# Altium footprint library SG_PCB_Fomin.PcbLib: 74 footprints (part 2 of 5)
Each footprint in its own frame and in the unit in brackets; x right, y up, seen from the top. Pads: shape width x height; smd on the part's side, far side on the other; paste and mask are expansions set on the pad; w line width, h text height; cw(c..) or ccw(c..) is an arc to the next point about the centre after c.
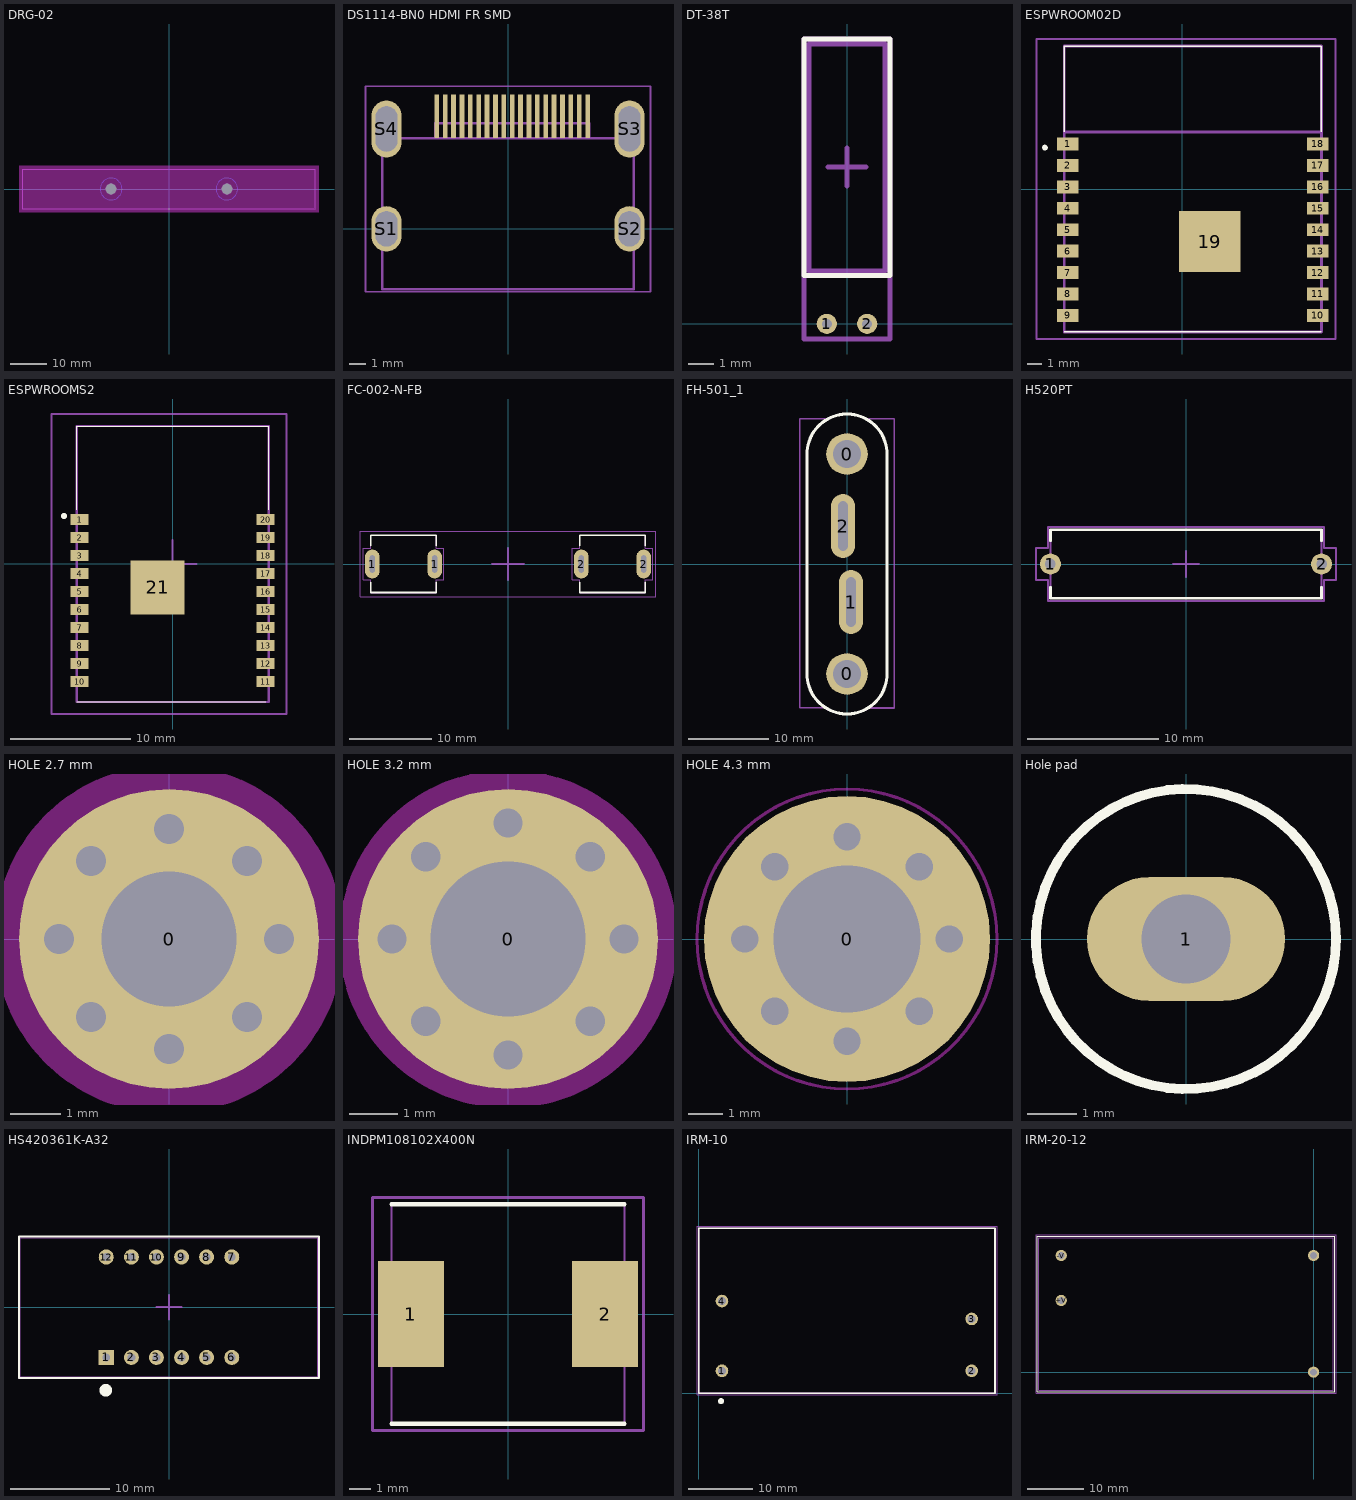
[diagram p1: the footprints below, top view; thin cyan lines are the x and y axes]

## DRG-02 [mm] "DIN RAIL MOUNT"
pads (2):
  round 0 hole 3 unplated: 0(-16,0) 0(16,0)
Top Layer keep-out:
  rectangle: -41.5,-6.5 41.5,6.5
Bottom Layer keep-out:
  circle w0.1: c-16,0 r3
  circle w0.1: c16,0 r3
Top Courtyard:
  lines w0.25: -40.5,-5.5 40.5,-5.5 40.5,5.5 -40.5,5.5 -40.5,-5.5

## DS1114-BN0 HDMI FR SMD [mm] "CON RECPT HDMI THT R/A W/O FLNG"
height 6.1
pads (23):
  rect 0.28x2.6 smd: 1(4.75,6.72) 2(4.25,6.72) 3(3.75,6.72) 4(3.25,6.72) 5(2.75,6.72) 6(2.25,6.72) 7(1.75,6.72) 8(1.25,6.72) 9(0.75,6.72) 10(0.25,6.72) 11(-0.25,6.72) 12(-0.75,6.72) 13(-1.25,6.72) 14(-1.75,6.72) 15(-2.25,6.72) 16(-2.75,6.72) 17(-3.25,6.72) 18(-3.75,6.72) 19(-4.25,6.72)
  oval 1.8x2.7 hole 1.3 slot 2.1 at 90 deg: S1(-7.25,0) S2(7.25,0)
  oval 1.8x3.4 hole 1.3 slot 2.7 at 90 deg: S3(7.25,5.96) S4(-7.25,5.96)
Top Assembly:
  lines w0.15: -7.5,-3.6 7.5,-3.6 ; -7.5,-3.6 -7.5,5.4 ; -7.5,-3.6 7.5,-3.6 ; -7.5,-3.6 -7.5,5.4 ; -7.5,5.4 7.5,5.4 ; -7.5,5.4 7.5,5.4 ; -4.35,6.3 -4.35,5.4 -4.35,6.3 ; -4.35,6.3 4.85,6.3 ; -4.35,6.3 4.85,6.3 ; 4.85,6.3 4.85,5.4 4.85,6.3 ; 7.5,-3.6 7.5,5.4 ; 7.5,-3.6 7.5,5.4
Top Courtyard:
  lines w0.1: -8.5,-3.75 -8.5,-3.575 -8.5,8.5 8.5,8.5 8.5,-3.75 -8.5,-3.75
3D body "10029449-111RLF.STEP": height 6.17, standoff -1.83, extent -8.1,-3.6 8.1,6.25

## DT-38T [mm] "Crystall oscillator"
pads (2):
  round 0.8 hole 0.4: 1(-0.8,0) 2(0.8,0)
Top Overlay:
  lines w0.2: -1.7,1.925 -1.7,11.3 1.7,11.3 1.7,1.925 -1.7,1.925
Top Assembly:
  lines w0.2: -1.5,2.1 1.5,2.1 1.5,11.1 -1.5,11.1 -1.5,2.1
Top Courtyard:
  lines w0.2: -0.75,6.225 0.75,6.225 ; 0,5.475 0,6.225 0,6.975 ; -1.7,-0.6 1.7,-0.6 1.7,2.025 1.7,11.3 -1.7,11.3 -1.7,-0.6
Top Designator:
  text ".Designator" at -5.098,4.667 h1
3D body "DT-38T.STEP": height 3, standoff -2.5, extent -1.5,-0.125 1.5,10.925

## ESPWROOM02D [mm]
pads (19):
  rect 1.5x0.9 smd: 1(-8.025,3.15) 2(-8.025,1.65) 3(-8.025,0.15) 4(-8.025,-1.35) 5(-8.025,-2.85) 6(-8.025,-4.35) 7(-8.025,-5.85) 8(-8.025,-7.35) 9(-8.025,-8.85) 10(9.475,-8.85) 11(9.475,-7.35) 12(9.475,-5.85) 13(9.475,-4.35) 14(9.475,-2.85) 15(9.475,-1.35) 16(9.475,0.15) 17(9.475,1.65) 18(9.475,3.15)
  rect 4.3x4.3 smd: 19(1.92,-3.675)
Top Overlay:
  lines w0.1: -8.275,-10 9.725,-10 ; -8.275,4 -8.275,10 9.725,10 9.725,4
  lines w0.2: -9.625,2.8 ccw(c-9.625,2.9) -9.625,3 ccw(c-9.625,2.9) -9.625,2.8
Top Assembly:
  lines w0.2: -8.275,4 9.725,4 ; -8.275,-10 9.725,-10 9.725,10 -8.275,10 -8.275,-10
Top Courtyard:
  lines w0.15: -10.225,-10.5 10.725,-10.5 10.725,10.5 -10.225,10.5 -10.225,-10.5
3D body "ESP-WROOM-02__4MB_.stp": height 3.2, standoff 0, extent -8.2,-10 9.8,10

## ESPWROOMS2 [mm]
pads (21):
  rect 1.5x0.9 smd: 1(-7.75,3.7) 2(-7.75,2.2) 3(-7.75,0.7) 4(-7.75,-0.8) 5(-7.75,-2.3) 6(-7.75,-3.8) 7(-7.75,-5.3) 8(-7.75,-6.8) 9(-7.75,-8.3) 10(-7.75,-9.8) 11(7.75,-9.8) 12(7.75,-8.3) 13(7.75,-6.8) 14(7.75,-5.3) 15(7.75,-3.8) 16(7.75,-2.3) 17(7.75,-0.8) 18(7.75,0.7) 19(7.75,2.2) 20(7.75,3.7)
  rect 4.5x4.5 smd: 21(-1.25,-1.95)
Top Overlay:
  lines w0.1: -8,-11.5 7.75,-11.5 ; -8,4.5 -8,11.5 8,11.5 8,4.5
  lines w0.4: -9.1,4 ccw(c-9.05,4) -9,4 ccw(c-9.05,4) -9.1,4
Top Assembly:
  lines w0.2: -8,-11.5 -8,11.5 8,11.5 8,-11.5 -8,-11.5
Top Courtyard:
  lines w0.15: -2,0 2,0 ; 0,-2 0,2 ; -10.1,-12.5 -10.1,12.5 9.5,12.5 9.5,-12.5 -10.1,-12.5
Top Designator:
  text ".Designator" at -7.246,-0.238 h1.52
3D body "ESP-WROOM-S2.stp": height 3, standoff 0, extent -8,-11.5 8,11.5

## FC-002-N-FB [mm] "Fuse_holder 6.3x30"
pads (4):
  oval 1.8x3.5 hole 0.6 slot 2.1 at 90 deg unplated: 1(-16.55,0) 1(-8.95,0) 2(8.95,0) 2(16.55,0)
Top Overlay:
  lines w0.2: -16.75,2.25 -16.75,3.5 -8.75,3.5 -8.75,2.25 ; -16.737,-2.235 -16.737,-3.485 -8.737,-3.485 -8.737,-2.235 ; 8.75,2.25 8.75,3.5 16.75,3.5 16.75,2.25 ; 8.763,-2.235 8.763,-3.485 16.763,-3.485 16.763,-2.235
Top Assembly:
  lines w0.1: -16.737,-3.485 -8.737,-3.485 ; 8.763,-3.485 16.763,-3.485 ; 8.75,-3.5 16.75,-3.5 ; 8.75,-3.5 8.75,-1.9 7.85,-1.9 7.85,1.9 8.75,1.9 8.75,3.5 ; 8.75,-3.5 16.75,-3.5 ; 8.75,3.5 16.75,3.5 ; 8.75,3.5 16.75,3.5 ; 16.75,-3.5 16.75,-1.9 17.65,-1.9 17.65,1.9 16.75,1.9 16.75,3.5 ; -17.65,-1.9 -16.75,-1.9 -16.75,-3.5 -8.75,-3.5 -8.75,-1.9 -7.85,-1.9 -7.85,1.9 -8.75,1.9 -8.75,3.5 -16.75,3.5 -16.75,1.9 -17.65,1.9 -17.65,-1.9
Top Courtyard:
  lines w0.05: -18,-4 18,-4 18,4 -18,4 -18,-4
  lines w0.2: -2,0 0,0 ; 0,-2 0,0 ; 0,2 0,0 ; 2,0 0,0
Top Designator:
  text ".Designator" at -7.496,-0.488 h1.52
3D body "User Library-FH-103 fuse holder 6_4mm.SLDPRT": height 10.7, standoff -2.98, extent 8.75,-3.505 16.752,3.505
3D body "User Library-FH-103 fuse holder 6_4mm.SLDPRT": height 10.7, standoff -2.98, extent -16.75,-3.5 -8.748,3.509

## FH-501_1 [mm] "Fuse holder"
pads (4):
  round 5.2 hole 3.45: 0(0,-13.75) 0(0,13.75)
  oval 3x8 hole 1.2 slot 6.2 at 90 deg: 1(0.5,-4.75) 2(-0.5,4.75)
Top Overlay:
  lines w0.4: -5,-13.75 ccw(c0,-13.75) 5,-13.75 5,13.75 ccw(c0,13.75) -5,13.75 -5,-13.75
Top Assembly:
  lines w0.15: -5,-13.75 ccw(c0,-13.75) 5,-13.75 5,13.75 ccw(c0,13.75) -5,13.75 -5,-13.75
Top Courtyard:
  lines w0.2: -2.75,-18 -2.75,-17.958 -5.925,-17.958 -5.925,18.158 -2.359,18.158 ; 2.359,18.158 5.925,18.158 5.925,-17.958 5.925,-18 2.75,-18
  lines w0.254: -2.75,-18 ccw(c0,-13.333) 2.75,-18 ; -2.359,18.158 cw(c0,13.75) 2.359,18.158
3D body "Fuse_holder.STEP": height 26.1, standoff -7, extent -5.925,-17.958 5.925,18.158

## H520PT [mm] "Fuse"
pads (2):
  round 1.6 hole 0.8 unplated: 1(-10.3,0) 2(10.3,0)
Top Overlay:
  lines w0.2: -10.3,-1.76 -10.3,-2.6 10.3,-2.6 10.3,-1.76 ; -10.3,1.76 -10.3,2.6 10.3,2.6 10.3,1.76
Top Assembly:
  lines w0.15: -10.3,-2.6 10.3,-2.6 10.3,2.6 -10.3,2.6 -10.3,-2.6
Top Courtyard:
  lines w0.15: -1,0 1,0 ; 0,-1 0,1 ; -11.4,-1.2 -11.4,1.2 -10.5,1.2 -10.5,2.8 10.5,2.8 10.5,1.2 11.4,1.2 11.4,-1.2 10.5,-1.2 10.5,-2.8 -10.5,-2.8 -10.5,-1.2 -11.4,-1.2
Top Designator:
  text ".Designator" at -3.8,-0.533 h0.8
3D body "User Library-H520PT.step": height 5.19, standoff -14.8, extent -10.3,-2.6 10.3,2.6

## HOLE 2.7 mm [mm]
pads (1):
  round 6 hole 2.7: 0(0,0)
via 1.556,1.556 diameter 0.6 hole 0.6
via -1.556,1.556 diameter 0.6 hole 0.6
via 1.556,-1.556 diameter 0.6 hole 0.6
via -2.2,0 diameter 0.6 hole 0.6
via 0,2.2 diameter 0.6 hole 0.6
via 0,-2.2 diameter 0.6 hole 0.6
via 2.2,0 diameter 0.6 hole 0.6
via -1.556,-1.556 diameter 0.6 hole 0.6
Keep-Out Layer:
  circle w3.5: c0,0 r1.75

## HOLE 3.2 mm [mm]
pads (1):
  round 6.2 hole 3.2: 0(0,0)
via 0,-2.4 diameter 0.6 hole 0.6
via 1.7,-1.7 diameter 0.6 hole 0.6
via 2.4,0 diameter 0.6 hole 0.6
via 1.7,1.7 diameter 0.6 hole 0.6
via 0,2.4 diameter 0.6 hole 0.6
via -1.7,1.7 diameter 0.6 hole 0.6
via -2.4,0 diameter 0.6 hole 0.6
via -1.7,-1.7 diameter 0.6 hole 0.6
Keep-Out Layer:
  circle w3.5: c0,0 r1.75

## HOLE 4.3 mm [mm]
pads (1):
  round 8.4 hole 4.3: 0(0,0)
via 0,3 diameter 0.8 hole 0.8
via 0,-3 diameter 0.8 hole 0.8
via 2.121,-2.121 diameter 0.8 hole 0.8
via 2.121,2.121 diameter 0.8 hole 0.8
via 3,0 diameter 0.8 hole 0.8
via -2.121,-2.121 diameter 0.8 hole 0.8
via -2.121,2.121 diameter 0.8 hole 0.8
via -3,0 diameter 0.8 hole 0.8
Keep-Out Layer:
  circle w0.1: c0,0 r4.402

## Hole pad [mm]
pads (1):
  oval 4x2.5 hole 1.8: 1(0,0)
Top Overlay:
  circle w0.2: c0,0 r3.029

## HS420361K-A32 [mil] "7-segment 0.36 inch"
pads (12):
  rect 60x60 hole 31.5: 1(-250,-200)
  round 60 hole 31.5: 2(-150,-200.02) 3(-50,-200) 4(50,-200) 5(150,-200) 6(250,-200) 7(250,200) 8(150,200) 9(50,200) 10(-50,200) 11(-150,200) 12(-250,200)
Top Overlay:
  circle w39.37: c-251.97,-330.71 r5.57
  lines w7.87: -597.2,-282.24 597.2,-282.24 597.2,282.24 -597.2,282.24 -597.2,-282.24
Top Assembly:
  lines w3.94: -597.36,-282.4 597.36,-282.4 597.36,282.4 -597.36,282.4 -597.36,-282.4
Top Courtyard:
  lines w3.94: -591.46,-276.5 591.46,-276.5 591.46,276.5 -591.46,276.5 -591.46,-276.5
  lines w7.87: -49.21,0 49.21,0 ; 0,-49.21 0,49.21
Top Designator:
  text ".Designator" at -304.96,-9.38 h60
3D body "User Library-3641_Red_jam.SLDPRT": height 279.53, standoff -216.54, extent -590.54,-275.58 590.56,275.6

## INDPM108102X400N [mm]
pads (2):
  rect 3.05x4.9 smd: 1(-4.5,0) 2(4.5,0)
Top Overlay:
  lines w0.2: -5.398,-5.08 5.398,-5.08 ; -5.398,5.08 5.398,5.08
Top Assembly:
  lines w0.1: -5.398,-5.08 5.398,-5.08 5.398,5.08 -5.398,5.08 -5.398,-5.08
Top Courtyard:
  lines w0.15: -6.275,-5.394 6.275,-5.394 6.275,5.394 -6.275,5.394 -6.275,-5.394
Top Designator:
  text ".Designator" at -7.546,-0.638 h1.52
3D body "IHLP4040DZER100M11.stp": height 3.88, standoff 0, extent -5.312,-5.111 5.311,5.105

## IRM-10 [mm]
pads (4):
  round 1.95 hole 1.24: 1(3.6,3.45) 2(42.1,3.45) 3(42.1,11.45) 4(3.6,14.2)
Top Overlay:
  circle w0.7: c3.461,-1.227 r0.111
  lines w0.254: 0,0 45.7,0 45.7,25.4 0,25.4 0,0
Top Assembly:
  lines w0.254: 0,0 0,25.4 45.7,25.4 45.7,0 0,0
Top Courtyard:
  lines w0.15: -0.25,-0.25 46,-0.25 46,25.75 -0.25,25.75 -0.25,-0.25
Top Designator:
  text ".Designator" at 20.2,11.717 h0.8
3D body "IRM-10-12.stp": height 22.05, standoff -3.5, extent 0.001,0 45.7,25.4

## IRM-20-12 [mm] "AC/DC Converter, 12В,1.8А,21.6Вт"
pads (4):
  round 2 hole 1.2 unplated: +V(-45,12.8) -V(-45,20.8) AC/L(0,0) AC/N(0,20.8)
Top Overlay:
  lines w0.2: -49.25,-3.5 3.75,-3.5 3.75,24.25 -49.25,24.25 -49.25,-3.5
Top Assembly:
  lines w0.15: -49,-3.25 -49,24 3.5,24 3.5,-3.25 -49,-3.25
Top Courtyard:
  lines w0.15: -49.5,-3.75 -49.5,24.5 4,24.5 4,-3.75 -49.5,-3.75
Top Designator:
  text ".Designator" at -28.3,11.467 h0.8
3D body "IRM-20.stp": height 24, standoff -3.5, extent -48.95,-3.2 3.45,24